# Altium footprint library SWLIB(150721).PcbLib: 348 footprints (part 19 of 22)
Each footprint in its own frame and in the unit in brackets; x right, y up, seen from the top. Pads: shape width x height; smd on the part's side, far side on the other; paste and mask are expansions set on the pad; w line width, h text height; cw(c..) or ccw(c..) is an arc to the next point about the centre after c.
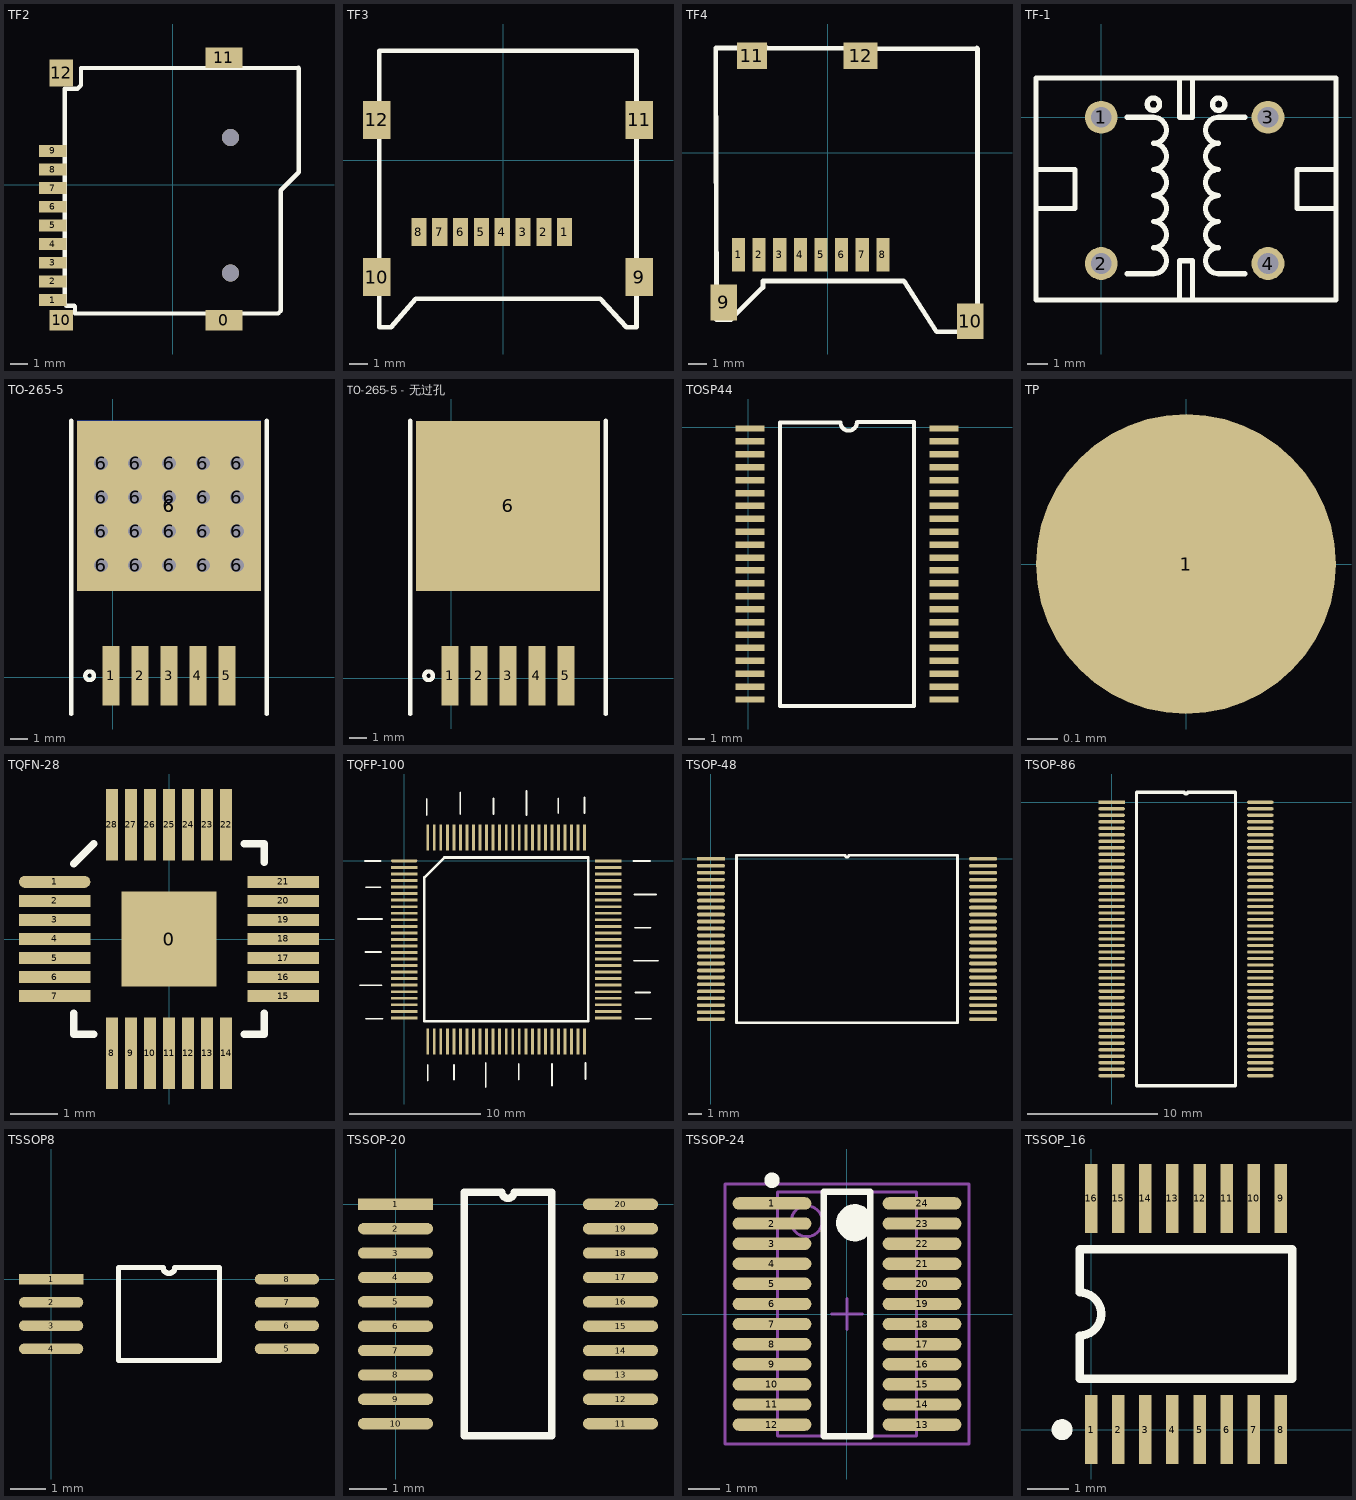
[diagram p18: the footprints below, top view; thin cyan lines are the x and y axes]

## TF2 [mm]
pads (13):
  rect 2.2x1.2 smd: 0(3.018,-8.004) 11(3.018,7.496)
  rect 1.6x0.7 smd: 1(-7.082,-6.804) 2(-7.082,-5.704) 3(-7.082,-4.604) 4(-7.082,-3.504) 5(-7.082,-2.404) 6(-7.082,-1.304) 7(-7.082,-0.204) 8(-7.082,0.896) 9(-7.082,1.996)
  rect 1.4x1.2 smd: 10(-6.582,-8.004)
  rect 1.4x1.6 smd: 12(-6.582,6.596)
via 3.418,-5.204 diameter 1 hole 1
via 3.418,2.796 diameter 1 hole 1
Top Overlay:
  lines w0.254: 6.218,-7.598 -5.77,-7.598 -5.77,-7.191 -5.821,-7.14 -6.278,-7.14 -6.38,-7.039 -6.38,5.661 -5.618,5.661 -5.415,5.864 -5.415,6.88 7.418,6.896 ; 6.269,-7.547 6.371,-7.445 6.371,-0.333 7.438,0.734 7.438,6.876

## TF3 [mm]
pads (12):
  rect 0.8x1.5 smd: 1(3.247,-3.804) 2(2.147,-3.804) 3(1.047,-3.804) 4(-0.053,-3.804) 5(-1.153,-3.804) 6(-2.253,-3.804) 7(-3.353,-3.804) 8(-4.453,-3.804)
  rect 1.45x2 smd: 9(7.179,-6.182) 10(-6.671,-6.182) 11(7.179,2.118) 12(-6.671,2.118)
Top Overlay:
  lines w0.254: -6.551,-8.832 -5.928,-8.832 -4.621,-7.332 5.119,-7.332 6.518,-8.832 7.049,-8.832 7.049,5.768 -6.551,5.768 -6.551,-8.832

## TF4 [mm]
pads (12):
  rect 0.7x1.8 smd: 1(-4.769,-5.43) 2(-3.669,-5.43) 3(-2.569,-5.43) 4(-1.469,-5.43) 5(-0.369,-5.43) 6(0.731,-5.43) 7(1.831,-5.43) 8(2.931,-5.43)
  rect 1.4x1.9 smd: 9(-5.559,-7.98) 10(7.591,-8.98)
  rect 1.6x1.4 smd: 11(-4.059,5.17)
  rect 1.8x1.4 smd: 12(1.741,5.17)
Top Overlay:
  lines w0.254: -3.245,5.594 -5.988,5.594 ; 7.88,5.543 -5.988,5.594 ; 7.931,5.594 7.982,5.543 7.982,-9.545 ; 8.033,-9.494 7.982,-9.545 ; -5.988,5.594 -5.937,-8.884 -5.175,-8.884 -3.469,-7.178 -3.469,-6.83 3.951,-6.83 4.048,-6.83 5.797,-9.545 7.982,-9.545

## TF-1 [mm]
pads (4):
  round 1.6 hole 1: 1(0,0) 2(0,-7.12) 3(8.12,0) 4(8.12,-7.12)
Top Overlay:
  circle w0.254: c5.715,0.635 r0.3
  circle w0.254: c2.54,0.635 r0.3
  lines w0.254: -3.175,-4.445 -1.27,-4.445 -1.27,-2.54 -3.175,-2.54 ; 1.27,-7.62 2.54,-7.62 ccw(c2.54,-6.985) 2.54,-6.35 ccw(c2.54,-5.715) 2.54,-5.08 ccw(c2.54,-4.445) 2.54,-3.81 ccw(c2.54,-3.175) 2.54,-2.54 ccw(c2.54,-1.905) 2.54,-1.27 ccw(c2.54,-0.635) 2.54,0 1.27,0 ; 3.81,-8.89 3.81,-6.985 4.445,-6.985 4.445,-8.89 ; 3.81,1.905 3.81,0 4.445,0 4.445,1.905 ; 6.985,-7.62 5.715,-7.62 cw(c5.715,-6.985) 5.715,-6.35 cw(c5.715,-5.715) 5.715,-5.08 cw(c5.715,-4.445) 5.715,-3.81 cw(c5.715,-3.175) 5.715,-2.54 cw(c5.715,-1.905) 5.715,-1.27 cw(c5.715,-0.635) 5.715,0 6.985,0 ; 11.43,-4.445 9.525,-4.445 9.525,-2.54 11.43,-2.54 ; -3.175,-8.89 -3.175,1.905 11.43,1.905 11.43,-8.89 -3.175,-8.89

## TO-265-5 [mm]
pads (27):
  rect 1x3.5 smd: 1(-0.098,0.1) 2(1.602,0.1) 3(3.302,0.1) 4(5.002,0.1) 5(6.702,0.1)
  round 1.5 hole 0.8: 6(-0.698,6.6) 6(-0.698,8.6) 6(-0.698,10.6) 6(-0.698,12.6) 6(1.302,6.6) 6(1.302,8.6) 6(1.302,10.6) 6(1.302,12.6) 6(3.302,6.6) 6(3.302,8.6) 6(3.302,10.6) 6(3.302,12.6) 6(5.302,6.6) 6(5.302,8.6) 6(5.302,10.6) 6(5.302,12.6) 6(7.302,6.6) 6(7.302,8.6) 6(7.302,10.6) 6(7.302,12.6)
  rect 10.8x10 smd: 6(3.302,10.1)
  rect 10.8x10 smd far side: 6(3.302,10.1)
Top Overlay:
  circle w0.254: c-1.368,0.1 r0.254
  lines w0.254: -2.448,-2.15 -2.448,15.1 ; 9.052,-2.15 9.052,15.1
3D body "User Library-TO-263-5.STEP": height 4.56, standoff 0, extent -1.778,-0.15 8.382,13.865

## TO-265-5 - 无过孔 [mm]
pads (6):
  rect 1x3.5 smd: 1(-0.066,0.136) 2(1.634,0.136) 3(3.334,0.136) 4(5.034,0.136) 5(6.734,0.136)
  rect 10.8x10 smd: 6(3.334,10.136)
Top Overlay:
  circle w0.254: c-1.336,0.136 r0.254
  lines w0.254: -2.416,-2.114 -2.416,15.136 ; 9.084,-2.114 9.084,15.136
3D body "User Library-TO-263-5.STEP": height 4.56, standoff 0, extent -1.746,-0.114 8.414,13.901

## TOSP44 [mm]
pads (44):
  rect 1.8x0.4 smd: 1(0.127,-0.076) 2(0.127,-0.876) 3(0.127,-1.676) 4(0.127,-2.476) 5(0.127,-3.276) 6(0.127,-4.076) 7(0.127,-4.876) 8(0.127,-5.676) 9(0.127,-6.476) 10(0.127,-7.276) 11(0.127,-8.076) 12(0.127,-8.876) 13(0.127,-9.676) 14(0.127,-10.476) 15(0.127,-11.276) 16(0.127,-12.076) 17(0.127,-12.876) 18(0.127,-13.676) 19(0.127,-14.476) 20(0.127,-15.276) 21(0.127,-16.076) 22(0.127,-16.876) 23(12.127,-16.876) 24(12.127,-16.076) 25(12.127,-15.276) 26(12.127,-14.476) 27(12.127,-13.676) 28(12.127,-12.876) 29(12.127,-12.076) 30(12.127,-11.276) 31(12.127,-10.476) 32(12.127,-9.676) 33(12.127,-8.876) 34(12.127,-8.076) 35(12.127,-7.276) 36(12.127,-6.476) 37(12.127,-5.676) 38(12.127,-4.876) 39(12.127,-4.076) 40(12.127,-3.276) 41(12.127,-2.476) 42(12.127,-1.676) 43(12.127,-0.876) 44(12.127,-0.076)
Top Overlay:
  lines w0.2: 1.962,-17.276 10.292,-17.276
  lines w0.254: 6.74,0.304 cw(c6.232,0.304) 5.724,0.304 1.982,0.304 1.982,-17.257 1.962,-17.276 10.292,-17.276 ; 6.76,0.324 10.292,0.324 10.292,-17.276 ; 10.292,-17.276 10.292,-17.276

## TP [mm]
pads (1):
  round 1 smd: 1(0,0)

## TQFN-28 [mm]
pads (29):
  rect 2x2 smd: 0(0,0)
  oval 1.5x0.25 smd: 1(-2.4,1.2)
  rect 1.5x0.25 smd: 2(-2.4,0.8) 3(-2.4,0.4) 4(-2.4,0) 5(-2.4,-0.4) 6(-2.4,-0.8) 7(-2.4,-1.2) 15(2.4,-1.2) 16(2.4,-0.8) 17(2.4,-0.4) 18(2.4,0) 19(2.4,0.4) 20(2.4,0.8) 21(2.4,1.2)
  rect 0.25x1.5 smd: 8(-1.2,-2.4) 9(-0.8,-2.4) 10(-0.4,-2.4) 11(0,-2.4) 12(0.4,-2.4) 13(0.8,-2.4) 14(1.2,-2.4) 22(1.2,2.4) 23(0.8,2.4) 24(0.4,2.4) 25(0,2.4) 26(-0.4,2.4) 27(-0.8,2.4) 28(-1.2,2.4)
Top Overlay:
  lines w0.152: -2,-1.556 -2,-2 -1.581,-2 ; -2,1.581 -1.581,2 ; 1.581,-2 2,-2 2,-1.556 ; 1.581,2 2,2 2,1.607
3D body: height 2, standoff 0.2, extent -2.007,-2.007 1.981,2.007

## TQFP-100 [mm]
pads (100):
  oval 2x0.22 smd: 1(0,0)
  rect 2x0.22 smd: 2(0,-0.5) 3(0,-1) 4(0,-1.5) 5(0,-2) 6(0,-2.5) 7(0,-3) 8(0,-3.5) 9(0,-4) 10(0,-4.5) 11(0,-5) 12(0,-5.5) 13(0,-6) 14(0,-6.5) 15(0,-7) 16(0,-7.5) 17(0,-8) 18(0,-8.5) 19(0,-9) 20(0,-9.5) 21(0,-10) 22(0,-10.5) 23(0,-11) 24(0,-11.5) 25(0,-12) 51(15.6,-12) 52(15.6,-11.5) 53(15.6,-11) 54(15.6,-10.5) 55(15.6,-10) 56(15.6,-9.5) 57(15.6,-9) 58(15.6,-8.5) 59(15.6,-8) 60(15.6,-7.5) 61(15.6,-7) 62(15.6,-6.5) 63(15.6,-6) 64(15.6,-5.5) 65(15.6,-5) 66(15.6,-4.5) 67(15.6,-4) 68(15.6,-3.5) 69(15.6,-3) 70(15.6,-2.5) 71(15.6,-2) 72(15.6,-1.5) 73(15.6,-1) 74(15.6,-0.5) 75(15.6,0)
  rect 0.22x2 smd: 26(1.8,-13.8) 27(2.3,-13.8) 28(2.8,-13.8) 29(3.3,-13.8) 30(3.8,-13.8) 31(4.3,-13.8) 32(4.8,-13.8) 33(5.3,-13.8) 34(5.8,-13.8) 35(6.3,-13.8) 36(6.8,-13.8) 37(7.3,-13.8) 38(7.8,-13.8) 39(8.3,-13.8) 40(8.8,-13.8) 41(9.3,-13.8) 42(9.8,-13.8) 43(10.3,-13.8) 44(10.8,-13.8) 45(11.3,-13.8) 46(11.8,-13.8) 47(12.3,-13.8) 48(12.8,-13.8) 49(13.3,-13.8) 50(13.8,-13.8) 76(13.8,1.8) 77(13.3,1.8) 78(12.8,1.8) 79(12.3,1.8) 80(11.8,1.8) 81(11.3,1.8) 82(10.8,1.8) 83(10.3,1.8) 84(9.8,1.8) 85(9.3,1.8) 86(8.8,1.8) 87(8.3,1.8) 88(7.8,1.8) 89(7.3,1.8) 90(6.8,1.8) 91(6.3,1.8) 92(5.8,1.8) 93(5.3,1.8) 94(4.8,1.8) 95(4.3,1.8) 96(3.8,1.8) 97(3.3,1.8) 98(2.8,1.8) 99(2.3,1.8) 100(1.8,1.8)
Top Overlay:
  lines w0.127: -3.531,-4.445 -1.676,-4.445 ; -3.404,-9.5 -1.727,-9.5 ; -3.023,0 -1.803,0 ; -2.972,-6.96 -1.753,-6.96 ; -2.946,-2.007 -1.803,-2.007 ; -2.921,-12.065 -1.651,-12.065 ; 1.727,3.48 1.727,4.75 ; 1.803,-16.789 1.803,-15.57 ; 3.81,-16.713 3.81,-15.57 ; 4.293,3.556 4.293,5.232 ; 6.248,-17.297 6.248,-15.443 ; 6.833,3.581 6.833,4.801 ; 8.763,-16.739 8.763,-15.519 ; 9.347,3.505 9.347,5.359 ; 11.303,-17.17 11.303,-15.494 ; 11.786,3.632 11.786,4.775 ; 13.792,3.632 13.792,4.851 ; 13.868,-16.688 13.868,-15.418 ; 17.526,0 18.796,0 ; 17.551,-7.62 19.406,-7.62 ; 17.602,-2.565 19.279,-2.565 ; 17.628,-5.105 18.847,-5.105 ; 17.678,-12.065 18.898,-12.065 ; 17.678,-10.058 18.821,-10.058
  lines w0.2: 1.535,-12.265 1.535,-1.27 3.07,0.265 14.065,0.265 14.065,-12.265 1.535,-12.265

## TSOP-48 [mm]
pads (48):
  rect 2x0.27 smd: 1(0,0)
  oval 2x0.27 smd: 2(0,-0.5) 3(0,-1) 4(0,-1.5) 5(0,-2) 6(0,-2.5) 7(0,-3) 8(0,-3.5) 9(0,-4) 10(0,-4.5) 11(0,-5) 12(0,-5.5) 13(0,-6) 14(0,-6.5) 15(0,-7) 16(0,-7.5) 17(0,-8) 18(0,-8.5) 19(0,-9) 20(0,-9.5) 21(0,-10) 22(0,-10.5) 23(0,-11) 24(0,-11.5) 25(19.5,-11.5) 26(19.5,-11) 27(19.5,-10.5) 28(19.5,-10) 29(19.5,-9.5) 30(19.5,-9) 31(19.5,-8.5) 32(19.5,-8) 33(19.5,-7.5) 34(19.5,-7) 35(19.5,-6.5) 36(19.5,-6) 37(19.5,-5.5) 38(19.5,-5) 39(19.5,-4.5) 40(19.5,-4) 41(19.5,-3.5) 42(19.5,-3) 43(19.5,-2.5) 44(19.5,-2) 45(19.5,-1.5) 46(19.5,-1) 47(19.5,-0.5) 48(19.5,0)
Top Overlay:
  lines w0.2: 1.835,-11.75 17.665,-11.75 17.665,0.25 9.875,0.25 cw(c9.75,0.25) 9.625,0.25 1.835,0.25 1.835,-11.75

## TSOP-86 [mil]
pads (86):
  rect 80x10 smd: 1(0,0)
  oval 80x10 smd: 2(0,-19.7) 3(0,-39.4) 4(0,-59.1) 5(0,-78.8) 6(0,-98.5) 7(0,-118.2) 8(0,-137.9) 9(0,-157.6) 10(0,-177.3) 11(0,-197) 12(0,-216.7) 13(0,-236.4) 14(0,-256.1) 15(0,-275.8) 16(0,-295.5) 17(0,-315.2) 18(0,-334.9) 19(0,-354.6) 20(0,-374.3) 21(0,-394) 22(0,-413.7) 23(0,-433.4) 24(0,-453.1) 25(0,-472.8) 26(0,-492.5) 27(0,-512.2) 28(0,-531.9) 29(0,-551.6) 30(0,-571.3) 31(0,-591) 32(0,-610.7) 33(0,-630.4) 34(0,-650.1) 35(0,-669.8) 36(0,-689.5) 37(0,-709.2) 38(0,-728.9) 39(0,-748.6) 40(0,-768.3) 41(0,-788) 42(0,-807.7) 43(0,-827.4) 44(450,-827.4) 45(450,-807.7) 46(450,-788) 47(450,-768.3) 48(450,-748.6) 49(450,-728.9) 50(450,-709.2) 51(450,-689.5) 52(450,-669.8) 53(450,-650.1) 54(450,-630.4) 55(450,-610.7) 56(450,-591) 57(450,-571.3) 58(450,-551.6) 59(450,-531.9) 60(450,-512.2) 61(450,-492.5) 62(450,-472.8) 63(450,-453.1) 64(450,-433.4) 65(450,-413.7) 66(450,-394) 67(450,-374.3) 68(450,-354.6) 69(450,-334.9) 70(450,-315.2) 71(450,-295.5) 72(450,-275.8) 73(450,-256.1) 74(450,-236.4) 75(450,-216.7) 76(450,-197) 77(450,-177.3) 78(450,-157.6) 79(450,-137.9) 80(450,-118.2) 81(450,-98.5) 82(450,-78.8) 83(450,-59.1) 84(450,-39.4) 85(450,-19.7) 86(450,0)
Top Overlay:
  lines w10: 220,29.85 ccw(c224.93,29.85) 229.85,29.85 ; 220.07,29.85 75,29.85 75,-857.25 375,-857.25 375,29.85 229.93,29.85

## TSSOP8 [mm]
pads (8):
  rect 1.8x0.3 smd: 1(0,0)
  oval 1.8x0.3 smd: 2(0,-0.65) 3(0,-1.3) 4(0,-1.95) 5(6.6,-1.95) 6(6.6,-1.3) 7(6.6,-0.65) 8(6.6,0)
Top Overlay:
  lines w0.15: 1.885,-2.275 1.885,0.325 3.137,0.325 ccw(c3.3,0.325) 3.462,0.325 4.715,0.325 4.715,-2.275 1.885,-2.275
3D body "TSSOP-8.STEP": height 1.15, standoff -0.05, extent 0.128,-2.491 6.528,0.509

## TSSOP-20 [mm]
pads (20):
  rect 2x0.3 smd: 1(0,0)
  oval 2x0.3 smd: 2(0,-0.65) 3(0,-1.3) 4(0,-1.95) 5(0,-2.6) 6(0,-3.25) 7(0,-3.9) 8(0,-4.55) 9(0,-5.2) 10(0,-5.85) 11(6,-5.85) 12(6,-5.2) 13(6,-4.55) 14(6,-3.9) 15(6,-3.25) 16(6,-2.6) 17(6,-1.95) 18(6,-1.3) 19(6,-0.65) 20(6,0)
Top Overlay:
  lines w0.2: 1.835,-6.175 1.835,0.325 2.838,0.325 ccw(c3,0.325) 3.163,0.325 4.165,0.325 4.165,-6.175 1.835,-6.175

## TSSOP-24 [mm] "TSSOP-24"
height 2.65
pads (24):
  oval 2.55x0.4 smd: 1(-2.425,3.575) 2(-2.425,2.925) 3(-2.425,2.275) 4(-2.425,1.625) 5(-2.425,0.975) 6(-2.425,0.325) 7(-2.425,-0.325) 8(-2.425,-0.975) 9(-2.425,-1.625) 10(-2.425,-2.275) 11(-2.425,-2.925) 12(-2.425,-3.575) 13(2.425,-3.575) 14(2.425,-2.925) 15(2.425,-2.275) 16(2.425,-1.625) 17(2.425,-0.975) 18(2.425,-0.325) 19(2.425,0.325) 20(2.425,0.975) 21(2.425,1.625) 22(2.425,2.275) 23(2.425,2.925) 24(2.425,3.575)
Top Overlay:
  circle w0.25: c-2.425,4.325 r0.125
  circle w0.6: c0.25,2.95 r0.3
  lines w0.2: -0.75,-3.95 -0.75,3.95 0.75,3.95 0.75,-3.95 -0.75,-3.95
Mechanical 13:
  circle w0.1: c-1.3,3 r0.5
  lines w0.1: -2.25,-3.95 -2.25,3.95 2.25,3.95 2.25,-3.95 -2.25,-3.95
Mechanical 15:
  lines w0.1: -0.5,0 0.5,0 ; 0,-0.5 0,0.5 ; -3.95,-4.2 -3.95,4.2 3.95,4.2 3.95,-4.2 -3.95,-4.2
3D body: height 2.65, standoff 0.1, extent -2.25,-3.95 2.25,3.95

## TSSOP_16 [mm]
pads (16):
  rect 0.3x1.65 smd: 1(0,0) 2(0.65,0) 3(1.3,0) 4(1.95,0) 5(2.6,0) 6(3.25,0) 7(3.9,0) 8(4.55,0) 9(4.55,5.55) 10(3.9,5.55) 11(3.25,5.55) 12(2.6,5.55) 13(1.95,5.55) 14(1.3,5.55) 15(0.65,5.55) 16(0,5.55)
Top Overlay:
  circle w0.25: c-0.7,0 r0.125
  lines w0.2: -0.275,1.225 4.825,1.225 4.825,4.325 -0.275,4.325 -0.275,3.292 cw(c-0.275,2.775) -0.275,2.258 -0.275,1.225
3D body "SW3dPS-SSOP16.STEP": height 1, standoff -0.1, extent -0.203,-0.229 4.775,5.766
3D body: height 1.1, standoff 0, extent 0.03,1.426 0.429,1.825